# Altium schematic symbol library TI Amplifiers and Linear Special Function Amplifier.SchLib: 708 symbols (part 10 of 34) (continued)
## TAS5261DKD (continued)

## TAS5261DKDG4
designator U?
315 W Mono Digital Amplifier Power Stage, 0 to 70 degC, 36-pin SOP (DKD36), Green (RoHS & no Sb/Br); Manufacturer: Texas Instruments; PartNumber: TAS5261DKDG4; Analog Supply Max [V]: 13.2; Analog Supply Min [V]: 10.8; Input Type: PWM; SubFamily: Mid/High-Power Amplifier; DatasheetVersion: SLES188; PackageVersion: 4204421-2/K, 06/2012; PackageReference: DKD36; PackageDescription: 36-Pin Plastic Small Outline, Body 15.9 x 11 mm, Pitch 0.65 mm; Supplier 1: Digi-Key; Supplier Part Number 1: TAS5261DKDG4-ND; Supplier 2: Newark; Supplier Part Number 2: 18M3143; Supplier 3: Mouser; Supplier Part Number 3: 595-TAS5261DKDG4; Eco-Plan: Green (RoHS & no Sb/Br); Mounting Technology: Surface Mount; ComponentLink1Description: Manufacturer URL; ComponentLink1URL: http://www.ti.com/; ComponentLink2Description: Datasheet; ComponentLink2URL: http://www.ti.com/general/docs/lit/getliterature.tsp?genericPartNumber=TAS5261&fileType=pdf; ComponentLink3Description: Package Specification; ComponentLink3URL: http://www.ti.com/lit/ds/symlink/tas5121i.pdf
footprint TI-DKD36_N (SOP, 36-Leads, Body 16x11.1mm, Pitch 0.65mm, IPC Medium Density)
footprint TI-DKD36_L (SOP, 36-Leads, Body 16x11.1mm, Pitch 0.65mm, IPC High Density)
footprint TI-DKD36_M (SOP, 36-Leads, Body 16x11.1mm, Pitch 0.65mm, IPC Low Density)
part A pins: 1 BST_A "Bootstrap, A side", 3 ~{OTW} (oc) "Overtemperature warning. Open drain, active low.", 4 ~{SD} (oc) "Shutdown. Open drain, active low.", 5 ~{RESET} (in) "Reset. Active low.", 6 PWM_A (in) "PWM for half-bridge A", 7 OC_ADJ (in) "Overcurrent threshold programming", 10 VREG "Internal voltage regulator", 11 M3 (in) "Reserved", 12 M2 (in) "Mode-selection 2 (MSB)", 13 M1 (in) "Mode-selection 1 (LSB)", 14 PWM_B (in) "PWM Input for half-bridge B", 18 BST_B "Bootstrap, B side", 25 OUT_B (hiz) "Output, half-bridge B", 26 OUT_B (hiz) "Output, half-bridge B", 27 OUT_B (hiz) "Output, half-bridge B", 28 OUT_A (hiz) "Output, half-bridge A", 29 OUT_A (hiz) "Output, half-bridge A", 30 OUT_A (hiz) "Output, half-bridge A"
part B pins: 2 GVDD_A (power) "Gate-drive voltage supply, A side", 8 GND (power) "Power ground", 9 AGND (power) "Analog ground", 15 VDD (power) "Input power supply", 16 GND (power) "Power ground", 17 GVDD_B (power) "Gate-drive voltage supply, B side", 19 PVDD_B (power) "PVDD supply for half-bridge B", 20 PVDD_B (power) "PVDD supply for half-bridge B", 21 PVDD_B (power) "PVDD supply for half-bridge B", 22 PGND (power) "Power ground", 23 PGND (power) "Power ground", 24 PGND (power) "Power ground", 31 PGND (power) "Power ground", 32 PGND (power) "Power ground", 33 PGND (power) "Power ground", 34 PVDD_A (power) "PVDD supply for half-bridge A", 35 PVDD_A (power) "PVDD supply for half-bridge A", 36 PVDD_A (power) "PVDD supply for half-bridge A"

## TAS5261DKDR
designator U?
315 W Mono Digital Amplifier Power Stage, 0 to 70 degC, 36-pin SOP (DKD36), Green (RoHS & no Sb/Br); Manufacturer: Texas Instruments; PartNumber: TAS5261DKDR; Analog Supply Max [V]: 13.2; Analog Supply Min [V]: 10.8; Input Type: PWM; SubFamily: Mid/High-Power Amplifier; DatasheetVersion: SLES188; PackageVersion: 4204421-2/K, 06/2012; PackageReference: DKD36; PackageDescription: 36-Pin Plastic Small Outline, Body 15.9 x 11 mm, Pitch 0.65 mm; Supplier 1: Digi-Key; Supplier Part Number 1: TAS5261DKDR-ND; Supplier 2: Mouser; Supplier Part Number 2: 595-TAS5261DKDR; Eco-Plan: Green (RoHS & no Sb/Br); Mounting Technology: Surface Mount; ComponentLink1Description: Manufacturer URL; ComponentLink1URL: http://www.ti.com/; ComponentLink2Description: Datasheet; ComponentLink2URL: http://www.ti.com/general/docs/lit/getliterature.tsp?genericPartNumber=TAS5261&fileType=pdf; ComponentLink3Description: Package Specification; ComponentLink3URL: http://www.ti.com/lit/ds/symlink/tas5121i.pdf
footprint TI-DKD36_N (SOP, 36-Leads, Body 16x11.1mm, Pitch 0.65mm, IPC Medium Density)
footprint TI-DKD36_L (SOP, 36-Leads, Body 16x11.1mm, Pitch 0.65mm, IPC High Density)
footprint TI-DKD36_M (SOP, 36-Leads, Body 16x11.1mm, Pitch 0.65mm, IPC Low Density)
part A pins: 1 BST_A "Bootstrap, A side", 3 ~{OTW} (oc) "Overtemperature warning. Open drain, active low.", 4 ~{SD} (oc) "Shutdown. Open drain, active low.", 5 ~{RESET} (in) "Reset. Active low.", 6 PWM_A (in) "PWM for half-bridge A", 7 OC_ADJ (in) "Overcurrent threshold programming", 10 VREG "Internal voltage regulator", 11 M3 (in) "Reserved", 12 M2 (in) "Mode-selection 2 (MSB)", 13 M1 (in) "Mode-selection 1 (LSB)", 14 PWM_B (in) "PWM Input for half-bridge B", 18 BST_B "Bootstrap, B side", 25 OUT_B (hiz) "Output, half-bridge B", 26 OUT_B (hiz) "Output, half-bridge B", 27 OUT_B (hiz) "Output, half-bridge B", 28 OUT_A (hiz) "Output, half-bridge A", 29 OUT_A (hiz) "Output, half-bridge A", 30 OUT_A (hiz) "Output, half-bridge A"
part B pins: 2 GVDD_A (power) "Gate-drive voltage supply, A side", 8 GND (power) "Power ground", 9 AGND (power) "Analog ground", 15 VDD (power) "Input power supply", 16 GND (power) "Power ground", 17 GVDD_B (power) "Gate-drive voltage supply, B side", 19 PVDD_B (power) "PVDD supply for half-bridge B", 20 PVDD_B (power) "PVDD supply for half-bridge B", 21 PVDD_B (power) "PVDD supply for half-bridge B", 22 PGND (power) "Power ground", 23 PGND (power) "Power ground", 24 PGND (power) "Power ground", 31 PGND (power) "Power ground", 32 PGND (power) "Power ground", 33 PGND (power) "Power ground", 34 PVDD_A (power) "PVDD supply for half-bridge A", 35 PVDD_A (power) "PVDD supply for half-bridge A", 36 PVDD_A (power) "PVDD supply for half-bridge A"

## TAS5261DKDRG4
designator U?
315 W Mono Digital Amplifier Power Stage, 0 to 70 degC, 36-pin SOP (DKD36), Green (RoHS & no Sb/Br); Manufacturer: Texas Instruments; PartNumber: TAS5261DKDRG4; Analog Supply Max [V]: 13.2; Analog Supply Min [V]: 10.8; Input Type: PWM; SubFamily: Mid/High-Power Amplifier; DatasheetVersion: SLES188; PackageVersion: 4204421-2/K, 06/2012; PackageReference: DKD36; PackageDescription: 36-Pin Plastic Small Outline, Body 15.9 x 11 mm, Pitch 0.65 mm; Supplier 1: Digi-Key; Supplier Part Number 1: TAS5261DKDRG4-ND; Supplier 2: Mouser; Supplier Part Number 2: 595-TAS5261DKDRG4; Eco-Plan: Green (RoHS & no Sb/Br); Mounting Technology: Surface Mount; ComponentLink1Description: Manufacturer URL; ComponentLink1URL: http://www.ti.com/; ComponentLink2Description: Datasheet; ComponentLink2URL: http://www.ti.com/general/docs/lit/getliterature.tsp?genericPartNumber=TAS5261&fileType=pdf; ComponentLink3Description: Package Specification; ComponentLink3URL: http://www.ti.com/lit/ds/symlink/tas5121i.pdf
footprint TI-DKD36_N (SOP, 36-Leads, Body 16x11.1mm, Pitch 0.65mm, IPC Medium Density)
footprint TI-DKD36_L (SOP, 36-Leads, Body 16x11.1mm, Pitch 0.65mm, IPC High Density)
footprint TI-DKD36_M (SOP, 36-Leads, Body 16x11.1mm, Pitch 0.65mm, IPC Low Density)
part A pins: 1 BST_A "Bootstrap, A side", 3 ~{OTW} (oc) "Overtemperature warning. Open drain, active low.", 4 ~{SD} (oc) "Shutdown. Open drain, active low.", 5 ~{RESET} (in) "Reset. Active low.", 6 PWM_A (in) "PWM for half-bridge A", 7 OC_ADJ (in) "Overcurrent threshold programming", 10 VREG "Internal voltage regulator", 11 M3 (in) "Reserved", 12 M2 (in) "Mode-selection 2 (MSB)", 13 M1 (in) "Mode-selection 1 (LSB)", 14 PWM_B (in) "PWM Input for half-bridge B", 18 BST_B "Bootstrap, B side", 25 OUT_B (hiz) "Output, half-bridge B", 26 OUT_B (hiz) "Output, half-bridge B", 27 OUT_B (hiz) "Output, half-bridge B", 28 OUT_A (hiz) "Output, half-bridge A", 29 OUT_A (hiz) "Output, half-bridge A", 30 OUT_A (hiz) "Output, half-bridge A"
part B pins: 2 GVDD_A (power) "Gate-drive voltage supply, A side", 8 GND (power) "Power ground", 9 AGND (power) "Analog ground", 15 VDD (power) "Input power supply", 16 GND (power) "Power ground", 17 GVDD_B (power) "Gate-drive voltage supply, B side", 19 PVDD_B (power) "PVDD supply for half-bridge B", 20 PVDD_B (power) "PVDD supply for half-bridge B", 21 PVDD_B (power) "PVDD supply for half-bridge B", 22 PGND (power) "Power ground", 23 PGND (power) "Power ground", 24 PGND (power) "Power ground", 31 PGND (power) "Power ground", 32 PGND (power) "Power ground", 33 PGND (power) "Power ground", 34 PVDD_A (power) "PVDD supply for half-bridge A", 35 PVDD_A (power) "PVDD supply for half-bridge A", 36 PVDD_A (power) "PVDD supply for half-bridge A"

## TAS5342ADDV
designator U?
100 W Stereo Digital Amplifier Power Stage, 0 to 70 degC, 44-pin SOP (DDV44), Green (RoHS & no Sb/Br); Manufacturer: Texas Instruments; PartNumber: TAS5342ADDV; Analog Supply Max [V]: 13.2; Analog Supply Min [V]: 10.8; Input Type: PWM; Max. Number of Speaker Outputs: 4; SubFamily: Mid/High-Power Amplifier; DatasheetVersion: SLAS623; PackageVersion: 4206011/G, 06/2011; PackageReference: DDV44-7600X3850TP; PackageDescription: 44-Pin Plastic Small Outline, Body 14 x 6.1 mm, Pitch 0.635 mm; Supplier 1: Digi-Key; Supplier Part Number 1: TAS5342ADDV-ND; Supplier 2: Mouser; Supplier Part Number 2: 595-TAS5342ADDV; Eco-Plan: Green (RoHS & no Sb/Br); Mounting Technology: Surface Mount; ComponentLink1Description: Manufacturer URL; ComponentLink1URL: http://www.ti.com/; ComponentLink2Description: Datasheet; ComponentLink2URL: http://www.ti.com/general/docs/lit/getliterature.tsp?genericPartNumber=TAS5342A&fileType=pdf; ComponentLink3Description: Package Specification; ComponentLink3URL: http://www.ti.com/lit/ds/symlink/tas5142.pdf
footprint TI-DDV44-7600X3850TP _N (SOP, 44-Leads, Body 14x6.1mm, Pitch 0.635mm, Thermal Pad 8.3x4.2mm, IPC Medium Density)
footprint TI-DDV44-7600X3850TP _L (SOP, 44-Leads, Body 14x6.1mm, Pitch 0.635mm, Thermal Pad 8.3x4.2mm, IPC High Density)
footprint TI-DDV44-7600X3850TP _M (SOP, 44-Leads, Body 14x6.1mm, Pitch 0.635mm, Thermal Pad 8.3x4.2mm, IPC Low Density)
part A pins: 2 ~{OTW} (oc) "Overtemperature warning signal, open-drain, active-low", 5 ~{SD} (oc) "Shutdown signal, open-drain, active-low", 6 PWM_A (in) "Input signal for half-bridge A", 7 ~{RESET_AB} (in) "Reset signal for half-bridge A and half-bridge B, active-low", 8 PWM_B (in) "Input signal for half-bridge B", 9 OC_ADJ (in) "Analog overcurrent programming pin", 12 VREG, 13 M3 (in) "Mode selection pin", 14 M2 (in) "Mode selection pin", 15 M1 (in) "Mode selection pin", 16 PWM_C (in) "Input signal for half-bridge C", 17 ~{RESET_CD} (in) "Reset signal for half-bridge C and half-bridge D, active-low", 18 PWM_D (in) "Input signal for half-bridge D", 24 BST_D "Bootstrap pin", 28 OUT_D (hiz) "Output, half-bridge D", 31 OUT_C (hiz) "Output, half-bridge C", 33 BST_C "Bootstrap pin, C-Side", 34 BST_B "Bootstrap pin, B-Side", 36 OUT_B (hiz) "Output, half-bridge B", 39 OUT_A (hiz) "Output, half-bridge A", 43 BST_A "Bootstrap pin, A-Side"
part B pins: 1 GVDD_B (power) "Gate-drive voltage supply", 10 GND (power) "Ground", 11 AGND (power) "Analog ground", 21 VDD (power) "Input power supply", 22 GVDD_C (power) "Gate-drive voltage supply", 23 GVDD_D (power) "Gate-drive voltage supply", 26 PVDD_D (power) "Power supply input for half-bridge D", 27 PVDD_D (power) "Power supply input for half-bridge D", 29 GND_D (power) "Power ground for half-bridge D", 30 GND_C (power) "Power ground for half-bridge C", 32 PVDD_C (power) "Power supply input for half-bridge C", 35 PVDD_B (power) "Power supply input for half-bridge B", 37 GND_B (power) "Power ground for half-bridge B", 38 GND_A (power) "Power ground for half-bridge A", 40 PVDD_A (power) "Power supply input for half-bridge A", 41 PVDD_A (power) "Power supply input for half-bridge A", 44 GVDD_A (power) "Gate-drive voltage supply; A-Side"
part C pins: 3 NC "No connect. Pins may be grounded.", 4 NC "No connect. Pins may be grounded.", 19 NC "No connect. Pins may be grounded.", 20 NC "No connect. Pins may be grounded.", 25 NC "No connect. Pins may be grounded.", 42 NC "No connect. Pins may be grounded."

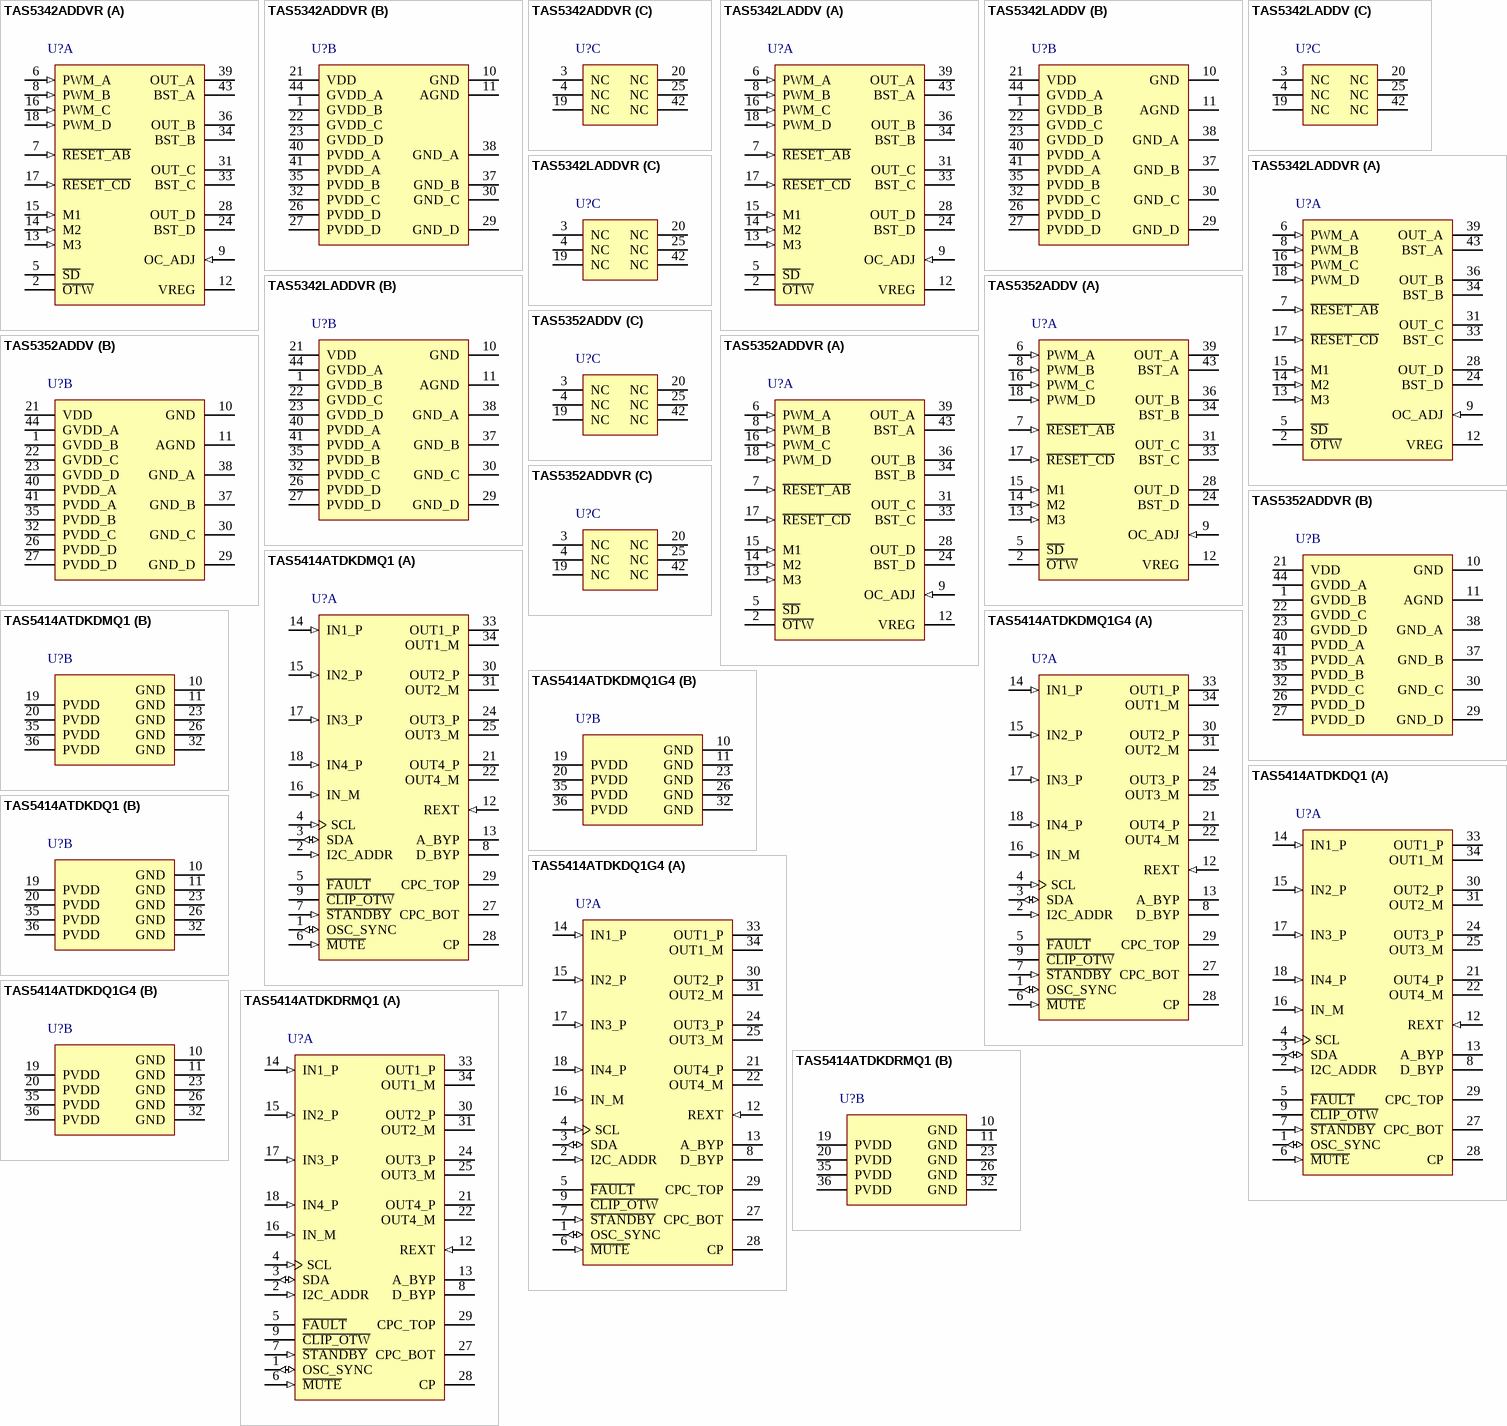
[diagram p13: symbols TAS5342ADDVR to TAS5414ATDKDRMQ1]

## TAS5342ADDVR
designator U?
100 W Stereo Digital Amplifier Power Stage, 0 to 70 degC, 44-pin SOP (DDV44), Green (RoHS & no Sb/Br); Manufacturer: Texas Instruments; PartNumber: TAS5342ADDVR; Analog Supply Max [V]: 13.2; Analog Supply Min [V]: 10.8; Input Type: PWM; Max. Number of Speaker Outputs: 4; SubFamily: Mid/High-Power Amplifier; DatasheetVersion: SLAS623; PackageVersion: 4206011/G, 06/2011; PackageReference: DDV44-7600X3850TP; PackageDescription: 44-Pin Plastic Small Outline, Body 14 x 6.1 mm, Pitch 0.635 mm; Supplier 1: Digi-Key; Supplier Part Number 1: 296-29863-2-ND; Supplier 2: Digi-Key; Supplier Part Number 2: 296-29863-1-ND; Supplier 3: Digi-Key; Supplier Part Number 3: 296-29863-6-ND; Supplier 4: Mouser; Supplier Part Number 4: 595-TAS5342ADDVR; Eco-Plan: Green (RoHS & no Sb/Br); Mounting Technology: Surface Mount; ComponentLink1Description: Manufacturer URL; ComponentLink1URL: http://www.ti.com/; ComponentLink2Description: Datasheet; ComponentLink2URL: http://www.ti.com/general/docs/lit/getliterature.tsp?genericPartNumber=TAS5342A&fileType=pdf; ComponentLink3Description: Package Specification; ComponentLink3URL: http://www.ti.com/lit/ds/symlink/tas5142.pdf
footprint TI-DDV44-7600X3850TP _N (SOP, 44-Leads, Body 14x6.1mm, Pitch 0.635mm, Thermal Pad 8.3x4.2mm, IPC Medium Density)
footprint TI-DDV44-7600X3850TP _L (SOP, 44-Leads, Body 14x6.1mm, Pitch 0.635mm, Thermal Pad 8.3x4.2mm, IPC High Density)
footprint TI-DDV44-7600X3850TP _M (SOP, 44-Leads, Body 14x6.1mm, Pitch 0.635mm, Thermal Pad 8.3x4.2mm, IPC Low Density)
part A pins: 2 ~{OTW} (oc) "Overtemperature warning signal, open-drain, active-low", 5 ~{SD} (oc) "Shutdown signal, open-drain, active-low", 6 PWM_A (in) "Input signal for half-bridge A", 7 ~{RESET_AB} (in) "Reset signal for half-bridge A and half-bridge B, active-low", 8 PWM_B (in) "Input signal for half-bridge B", 9 OC_ADJ (in) "Analog overcurrent programming pin", 12 VREG, 13 M3 (in) "Mode selection pin", 14 M2 (in) "Mode selection pin", 15 M1 (in) "Mode selection pin", 16 PWM_C (in) "Input signal for half-bridge C", 17 ~{RESET_CD} (in) "Reset signal for half-bridge C and half-bridge D, active-low", 18 PWM_D (in) "Input signal for half-bridge D", 24 BST_D "Bootstrap pin", 28 OUT_D (hiz) "Output, half-bridge D", 31 OUT_C (hiz) "Output, half-bridge C", 33 BST_C "Bootstrap pin, C-Side", 34 BST_B "Bootstrap pin, B-Side", 36 OUT_B (hiz) "Output, half-bridge B", 39 OUT_A (hiz) "Output, half-bridge A", 43 BST_A "Bootstrap pin, A-Side"
part B pins: 1 GVDD_B (power) "Gate-drive voltage supply", 10 GND (power) "Ground", 11 AGND (power) "Analog ground", 21 VDD (power) "Input power supply", 22 GVDD_C (power) "Gate-drive voltage supply", 23 GVDD_D (power) "Gate-drive voltage supply", 26 PVDD_D (power) "Power supply input for half-bridge D", 27 PVDD_D (power) "Power supply input for half-bridge D", 29 GND_D (power) "Power ground for half-bridge D", 30 GND_C (power) "Power ground for half-bridge C", 32 PVDD_C (power) "Power supply input for half-bridge C", 35 PVDD_B (power) "Power supply input for half-bridge B", 37 GND_B (power) "Power ground for half-bridge B", 38 GND_A (power) "Power ground for half-bridge A", 40 PVDD_A (power) "Power supply input for half-bridge A", 41 PVDD_A (power) "Power supply input for half-bridge A", 44 GVDD_A (power) "Gate-drive voltage supply; A-Side"
part C pins: 3 NC "No connect. Pins may be grounded.", 4 NC "No connect. Pins may be grounded.", 19 NC "No connect. Pins may be grounded.", 20 NC "No connect. Pins may be grounded.", 25 NC "No connect. Pins may be grounded.", 42 NC "No connect. Pins may be grounded."

## TAS5342LADDV
designator U?
100 W Stereo Digital Amplifier Power Stage, 0 to 70 degC, 44-pin SOP (DDV44), Green (RoHS & no Sb/Br); Manufacturer: Texas Instruments; PartNumber: TAS5342LADDV; Analog Supply Max [V]: 13.2; Analog Supply Min [V]: 10.8; Input Type: PWM; Max. Number of Speaker Outputs: 4; SubFamily: Mid/High-Power Amplifier; DatasheetVersion: SLAS624; PackageVersion: 4206011/G, 06/2011; PackageReference: DDV44-7600X3850TP; PackageDescription: 44-Pin Plastic Small Outline, Body 14 x 6.1 mm, Pitch 0.635 mm; Supplier 1: Digi-Key; Supplier Part Number 1: 296-34185-5-ND; Supplier 2: Newark; Supplier Part Number 2: 45P8191; Supplier 3: Mouser; Supplier Part Number 3: 595-TAS5342LADDV; Eco-Plan: Green (RoHS & no Sb/Br); Mounting Technology: Surface Mount; ComponentLink1Description: Manufacturer URL; ComponentLink1URL: http://www.ti.com/; ComponentLink2Description: Datasheet; ComponentLink2URL: http://www.ti.com/general/docs/lit/getliterature.tsp?genericPartNumber=TAS5342LA&fileType=pdf; ComponentLink3Description: Package Specification; ComponentLink3URL: http://www.ti.com/lit/ds/symlink/tas5142.pdf
footprint TI-DDV44-7600X3850TP _N (SOP, 44-Leads, Body 14x6.1mm, Pitch 0.635mm, Thermal Pad 8.3x4.2mm, IPC Medium Density)
footprint TI-DDV44-7600X3850TP _L (SOP, 44-Leads, Body 14x6.1mm, Pitch 0.635mm, Thermal Pad 8.3x4.2mm, IPC High Density)
footprint TI-DDV44-7600X3850TP _M (SOP, 44-Leads, Body 14x6.1mm, Pitch 0.635mm, Thermal Pad 8.3x4.2mm, IPC Low Density)
part A pins: 2 ~{OTW} (oc) "Overtemperature warning signal, open-drain, active-low", 5 ~{SD} (oc) "Shutdown signal, open-drain, active-low", 6 PWM_A (in) "PWM Input signal for half-bridge A", 7 ~{RESET_AB} (in) "Reset signal for half-bridge A and half-bridge B, active-low", 8 PWM_B (in) "PWM Input signal for half-bridge B", 9 OC_ADJ (in) "Analog overcurrent programming pin", 12 VREG "Internal voltage regulator", 13 M3 (in) "Mode selection pin (MSB)", 14 M2 (in) "Mode selection pin", 15 M1 (in) "Mode selection pin (LSB)", 16 PWM_C (in) "PWM Input signal for half-bridge C", 17 ~{RESET_CD} (in) "Reset signal for half-bridge C and half-bridge D, active-low", 18 PWM_D (in) "PWM Input signal for half-bridge D", 24 BST_D "Bootstrap pin, D-Side", 28 OUT_D (hiz) "Output, half-bridge D", 31 OUT_C (hiz) "Output, half-bridge C", 33 BST_C "Bootstrap pin, C-Side", 34 BST_B "Bootstrap pin, B-Side", 36 OUT_B (hiz) "Output, half-bridge B", 39 OUT_A (hiz) "Output, half-bridge A", 43 BST_A "Bootstrap pin, A-Side"
part B pins: 1 GVDD_B (power) "Gate-drive voltage supply; B-Side", 10 GND (power) "Ground", 11 AGND (power) "Analog ground", 21 VDD (power) "Input power supply", 22 GVDD_C (power) "Gate-drive voltage supply; C-Side", 23 GVDD_D (power) "Gate-drive voltage supply; D-Side", 26 PVDD_D (power) "Power supply input for half-bridge D", 27 PVDD_D (power) "Power supply input for half-bridge D", 29 GND_D (power) "Power ground for half-bridge D", 30 GND_C (power) "Power ground for half-bridge C", 32 PVDD_C (power) "Power supply input for half-bridge C", 35 PVDD_B (power) "Power supply input for half-bridge B", 37 GND_B (power) "Power ground for half-bridge B", 38 GND_A (power) "Power ground for half-bridge A", 40 PVDD_A (power) "Power supply input for half-bridge A", 41 PVDD_A (power) "Power supply input for half-bridge A", 44 GVDD_A (power) "Gate-drive voltage supply; A-Side"
part C pins: 3 NC "No connect. Pins may be grounded.", 4 NC "No connect. Pins may be grounded.", 19 NC "No connect. Pins may be grounded.", 20 NC "No connect. Pins may be grounded.", 25 NC "No connect. Pins may be grounded.", 42 NC "No connect. Pins may be grounded."

## TAS5342LADDVR
designator U?
100 W Stereo Digital Amplifier Power Stage, 0 to 70 degC, 44-pin SOP (DDV44), Green (RoHS & no Sb/Br); Manufacturer: Texas Instruments; PartNumber: TAS5342LADDVR; Analog Supply Max [V]: 13.2; Analog Supply Min [V]: 10.8; Input Type: PWM; Max. Number of Speaker Outputs: 4; SubFamily: Mid/High-Power Amplifier; DatasheetVersion: SLAS624; PackageVersion: 4206011/G, 06/2011; PackageReference: DDV44-7600X3850TP; PackageDescription: 44-Pin Plastic Small Outline, Body 14 x 6.1 mm, Pitch 0.635 mm; Supplier 1: Digi-Key; Supplier Part Number 1: TAS5342LADDVR-ND; Supplier 2: Mouser; Supplier Part Number 2: 595-TAS5342LADDVR; Eco-Plan: Green (RoHS & no Sb/Br); Mounting Technology: Surface Mount; ComponentLink1Description: Manufacturer URL; ComponentLink1URL: http://www.ti.com/; ComponentLink2Description: Datasheet; ComponentLink2URL: http://www.ti.com/general/docs/lit/getliterature.tsp?genericPartNumber=TAS5342LA&fileType=pdf; ComponentLink3Description: Package Specification; ComponentLink3URL: http://www.ti.com/lit/ds/symlink/tas5142.pdf
footprint TI-DDV44-7600X3850TP _N (SOP, 44-Leads, Body 14x6.1mm, Pitch 0.635mm, Thermal Pad 8.3x4.2mm, IPC Medium Density)
footprint TI-DDV44-7600X3850TP _L (SOP, 44-Leads, Body 14x6.1mm, Pitch 0.635mm, Thermal Pad 8.3x4.2mm, IPC High Density)
footprint TI-DDV44-7600X3850TP _M (SOP, 44-Leads, Body 14x6.1mm, Pitch 0.635mm, Thermal Pad 8.3x4.2mm, IPC Low Density)
part A pins: 2 ~{OTW} (oc) "Overtemperature warning signal, open-drain, active-low", 5 ~{SD} (oc) "Shutdown signal, open-drain, active-low", 6 PWM_A (in) "PWM Input signal for half-bridge A", 7 ~{RESET_AB} (in) "Reset signal for half-bridge A and half-bridge B, active-low", 8 PWM_B (in) "PWM Input signal for half-bridge B", 9 OC_ADJ (in) "Analog overcurrent programming pin", 12 VREG "Internal voltage regulator", 13 M3 (in) "Mode selection pin (MSB)", 14 M2 (in) "Mode selection pin", 15 M1 (in) "Mode selection pin (LSB)", 16 PWM_C (in) "PWM Input signal for half-bridge C", 17 ~{RESET_CD} (in) "Reset signal for half-bridge C and half-bridge D, active-low", 18 PWM_D (in) "PWM Input signal for half-bridge D", 24 BST_D "Bootstrap pin, D-Side", 28 OUT_D (hiz) "Output, half-bridge D", 31 OUT_C (hiz) "Output, half-bridge C", 33 BST_C "Bootstrap pin, C-Side", 34 BST_B "Bootstrap pin, B-Side", 36 OUT_B (hiz) "Output, half-bridge B", 39 OUT_A (hiz) "Output, half-bridge A", 43 BST_A "Bootstrap pin, A-Side"
part B pins: 1 GVDD_B (power) "Gate-drive voltage supply; B-Side", 10 GND (power) "Ground", 11 AGND (power) "Analog ground", 21 VDD (power) "Input power supply", 22 GVDD_C (power) "Gate-drive voltage supply; C-Side", 23 GVDD_D (power) "Gate-drive voltage supply; D-Side", 26 PVDD_D (power) "Power supply input for half-bridge D", 27 PVDD_D (power) "Power supply input for half-bridge D", 29 GND_D (power) "Power ground for half-bridge D", 30 GND_C (power) "Power ground for half-bridge C", 32 PVDD_C (power) "Power supply input for half-bridge C", 35 PVDD_B (power) "Power supply input for half-bridge B", 37 GND_B (power) "Power ground for half-bridge B", 38 GND_A (power) "Power ground for half-bridge A", 40 PVDD_A (power) "Power supply input for half-bridge A", 41 PVDD_A (power) "Power supply input for half-bridge A", 44 GVDD_A (power) "Gate-drive voltage supply; A-Side"
part C pins: 3 NC "No connect. Pins may be grounded.", 4 NC "No connect. Pins may be grounded.", 19 NC "No connect. Pins may be grounded.", 20 NC "No connect. Pins may be grounded.", 25 NC "No connect. Pins may be grounded.", 42 NC "No connect. Pins may be grounded."

## TAS5352ADDV
designator U?
125 W Stereo Digital Amplifier Power Stage, 0 to 70 degC, 44-pin SOP (DDV44), Green (RoHS & no Sb/Br); Manufacturer: Texas Instruments; PartNumber: TAS5352ADDV; Analog Supply Max [V]: 13.2; Analog Supply Min [V]: 10.8; Input Type: PWM; Max. Number of Speaker Outputs: 4; SubFamily: Mid/High-Power Amplifier; DatasheetVersion: SLES239; PackageVersion: 4206011/G, 06/2011; PackageReference: DDV44-7600X3850TP; PackageDescription: 44-Pin Plastic Small Outline, Body 14 x 6.1 mm, Pitch 0.635 mm; Supplier 1: Digi-Key; Supplier Part Number 1: 296-34187-5-ND; Supplier 2: Newark; Supplier Part Number 2: 45P8193; Supplier 3: Mouser; Supplier Part Number 3: 595-TAS5352ADDV; Eco-Plan: Green (RoHS & no Sb/Br); Mounting Technology: Surface Mount; ComponentLink1Description: Manufacturer URL; ComponentLink1URL: http://www.ti.com/; ComponentLink2Description: Datasheet; ComponentLink2URL: http://www.ti.com/general/docs/lit/getliterature.tsp?genericPartNumber=TAS5352A&fileType=pdf; ComponentLink3Description: Package Specification; ComponentLink3URL: http://www.ti.com/lit/ds/symlink/tas5142.pdf
footprint TI-DDV44-7600X3850TP _N (SOP, 44-Leads, Body 14x6.1mm, Pitch 0.635mm, Thermal Pad 8.3x4.2mm, IPC Medium Density)
footprint TI-DDV44-7600X3850TP _L (SOP, 44-Leads, Body 14x6.1mm, Pitch 0.635mm, Thermal Pad 8.3x4.2mm, IPC High Density)
footprint TI-DDV44-7600X3850TP _M (SOP, 44-Leads, Body 14x6.1mm, Pitch 0.635mm, Thermal Pad 8.3x4.2mm, IPC Low Density)
part A pins: 2 ~{OTW} (oc) "Overtemperature warning signal, open-drain, active-low", 5 ~{SD} (oc) "Shutdown signal, open-drain, active-low", 6 PWM_A (in) "PWM Input signal for half-bridge A", 7 ~{RESET_AB} (in) "Reset signal for half-bridge A and half-bridge B, active-low", 8 PWM_B (in) "PWM Input signal for half-bridge B", 9 OC_ADJ (in) "Analog overcurrent programming pin", 12 VREG "Internal voltage regulator", 13 M3 (in) "Mode selection pin (MSB)", 14 M2 (in) "Mode selection pin", 15 M1 (in) "Mode selection pin (LSB)", 16 PWM_C (in) "PWM Input signal for half-bridge C", 17 ~{RESET_CD} (in) "Reset signal for half-bridge C and half-bridge D, active-low", 18 PWM_D (in) "PWM Input signal for half-bridge D", 24 BST_D "Bootstrap pin, D-Side", 28 OUT_D (hiz) "Output, half-bridge D", 31 OUT_C (hiz) "Output, half-bridge C", 33 BST_C "Bootstrap pin, C-Side", 34 BST_B "Bootstrap pin, B-Side", 36 OUT_B (hiz) "Output, half-bridge B", 39 OUT_A (hiz) "Output, half-bridge A", 43 BST_A "Bootstrap pin, A-Side"
part B pins: 1 GVDD_B (power) "Gate-drive voltage supply; B-Side", 10 GND (power) "Ground", 11 AGND (power) "Analog ground", 21 VDD (power) "Input power supply", 22 GVDD_C (power) "Gate-drive voltage supply; C-Side", 23 GVDD_D (power) "Gate-drive voltage supply; D-Side", 26 PVDD_D (power) "Power supply input for half-bridge D", 27 PVDD_D (power) "Power supply input for half-bridge D", 29 GND_D (power) "Power ground for half-bridge D", 30 GND_C (power) "Power ground for half-bridge C", 32 PVDD_C (power) "Power supply input for half-bridge C", 35 PVDD_B (power) "Power supply input for half-bridge B", 37 GND_B (power) "Power ground for half-bridge B", 38 GND_A (power) "Power ground for half-bridge A", 40 PVDD_A (power) "Power supply input for half-bridge A", 41 PVDD_A (power) "Power supply input for half-bridge A", 44 GVDD_A (power) "Gate-drive voltage supply; A-Side"
part C pins: 3 NC "No connect. Pins may be grounded.", 4 NC "No connect. Pins may be grounded.", 19 NC "No connect. Pins may be grounded.", 20 NC "No connect. Pins may be grounded.", 25 NC "No connect. Pins may be grounded.", 42 NC "No connect. Pins may be grounded."

## TAS5352ADDVR
designator U?
125 W Stereo Digital Amplifier Power Stage, 0 to 70 degC, 44-pin SOP (DDV44), Green (RoHS & no Sb/Br); Manufacturer: Texas Instruments; PartNumber: TAS5352ADDVR; Analog Supply Max [V]: 13.2; Analog Supply Min [V]: 10.8; Input Type: PWM; Max. Number of Speaker Outputs: 4; SubFamily: Mid/High-Power Amplifier; DatasheetVersion: SLES239; PackageVersion: 4206011/G, 06/2011; PackageReference: DDV44-7600X3850TP; PackageDescription: 44-Pin Plastic Small Outline, Body 14 x 6.1 mm, Pitch 0.635 mm; Supplier 1: Digi-Key; Supplier Part Number 1: TAS5352ADDVR-ND; Supplier 2: Newark; Supplier Part Number 2: 45P8194; Supplier 3: Mouser; Supplier Part Number 3: 595-TAS5352ADDVR; Eco-Plan: Green (RoHS & no Sb/Br); Mounting Technology: Surface Mount; ComponentLink1Description: Manufacturer URL; ComponentLink1URL: http://www.ti.com/; ComponentLink2Description: Datasheet; ComponentLink2URL: http://www.ti.com/general/docs/lit/getliterature.tsp?genericPartNumber=TAS5352A&fileType=pdf; ComponentLink3Description: Package Specification; ComponentLink3URL: http://www.ti.com/lit/ds/symlink/tas5142.pdf
footprint TI-DDV44-7600X3850TP _N (SOP, 44-Leads, Body 14x6.1mm, Pitch 0.635mm, Thermal Pad 8.3x4.2mm, IPC Medium Density)
footprint TI-DDV44-7600X3850TP _L (SOP, 44-Leads, Body 14x6.1mm, Pitch 0.635mm, Thermal Pad 8.3x4.2mm, IPC High Density)
footprint TI-DDV44-7600X3850TP _M (SOP, 44-Leads, Body 14x6.1mm, Pitch 0.635mm, Thermal Pad 8.3x4.2mm, IPC Low Density)
part A pins: 2 ~{OTW} (oc) "Overtemperature warning signal, open-drain, active-low", 5 ~{SD} (oc) "Shutdown signal, open-drain, active-low", 6 PWM_A (in) "PWM Input signal for half-bridge A", 7 ~{RESET_AB} (in) "Reset signal for half-bridge A and half-bridge B, active-low", 8 PWM_B (in) "PWM Input signal for half-bridge B", 9 OC_ADJ (in) "Analog overcurrent programming pin", 12 VREG "Internal voltage regulator", 13 M3 (in) "Mode selection pin (MSB)", 14 M2 (in) "Mode selection pin", 15 M1 (in) "Mode selection pin (LSB)", 16 PWM_C (in) "PWM Input signal for half-bridge C", 17 ~{RESET_CD} (in) "Reset signal for half-bridge C and half-bridge D, active-low", 18 PWM_D (in) "PWM Input signal for half-bridge D", 24 BST_D "Bootstrap pin, D-Side", 28 OUT_D (hiz) "Output, half-bridge D", 31 OUT_C (hiz) "Output, half-bridge C", 33 BST_C "Bootstrap pin, C-Side", 34 BST_B "Bootstrap pin, B-Side", 36 OUT_B (hiz) "Output, half-bridge B", 39 OUT_A (hiz) "Output, half-bridge A", 43 BST_A "Bootstrap pin, A-Side"
part B pins: 1 GVDD_B (power) "Gate-drive voltage supply; B-Side", 10 GND (power) "Ground", 11 AGND (power) "Analog ground", 21 VDD (power) "Input power supply", 22 GVDD_C (power) "Gate-drive voltage supply; C-Side", 23 GVDD_D (power) "Gate-drive voltage supply; D-Side", 26 PVDD_D (power) "Power supply input for half-bridge D", 27 PVDD_D (power) "Power supply input for half-bridge D", 29 GND_D (power) "Power ground for half-bridge D", 30 GND_C (power) "Power ground for half-bridge C", 32 PVDD_C (power) "Power supply input for half-bridge C", 35 PVDD_B (power) "Power supply input for half-bridge B", 37 GND_B (power) "Power ground for half-bridge B", 38 GND_A (power) "Power ground for half-bridge A", 40 PVDD_A (power) "Power supply input for half-bridge A", 41 PVDD_A (power) "Power supply input for half-bridge A", 44 GVDD_A (power) "Gate-drive voltage supply; A-Side"
part C pins: 3 NC "No connect. Pins may be grounded.", 4 NC "No connect. Pins may be grounded.", 19 NC "No connect. Pins may be grounded.", 20 NC "No connect. Pins may be grounded.", 25 NC "No connect. Pins may be grounded.", 42 NC "No connect. Pins may be grounded."